# Altium footprint library 单平台共享多内核实验平台研制与应用.PcbLib: 46 footprints (part 1 of 3)
Each footprint in its own frame and in the unit in brackets; x right, y up, seen from the top. Pads: shape width x height; smd on the part's side, far side on the other; paste and mask are expansions set on the pad; w line width, h text height; cw(c..) or ccw(c..) is an arc to the next point about the centre after c.
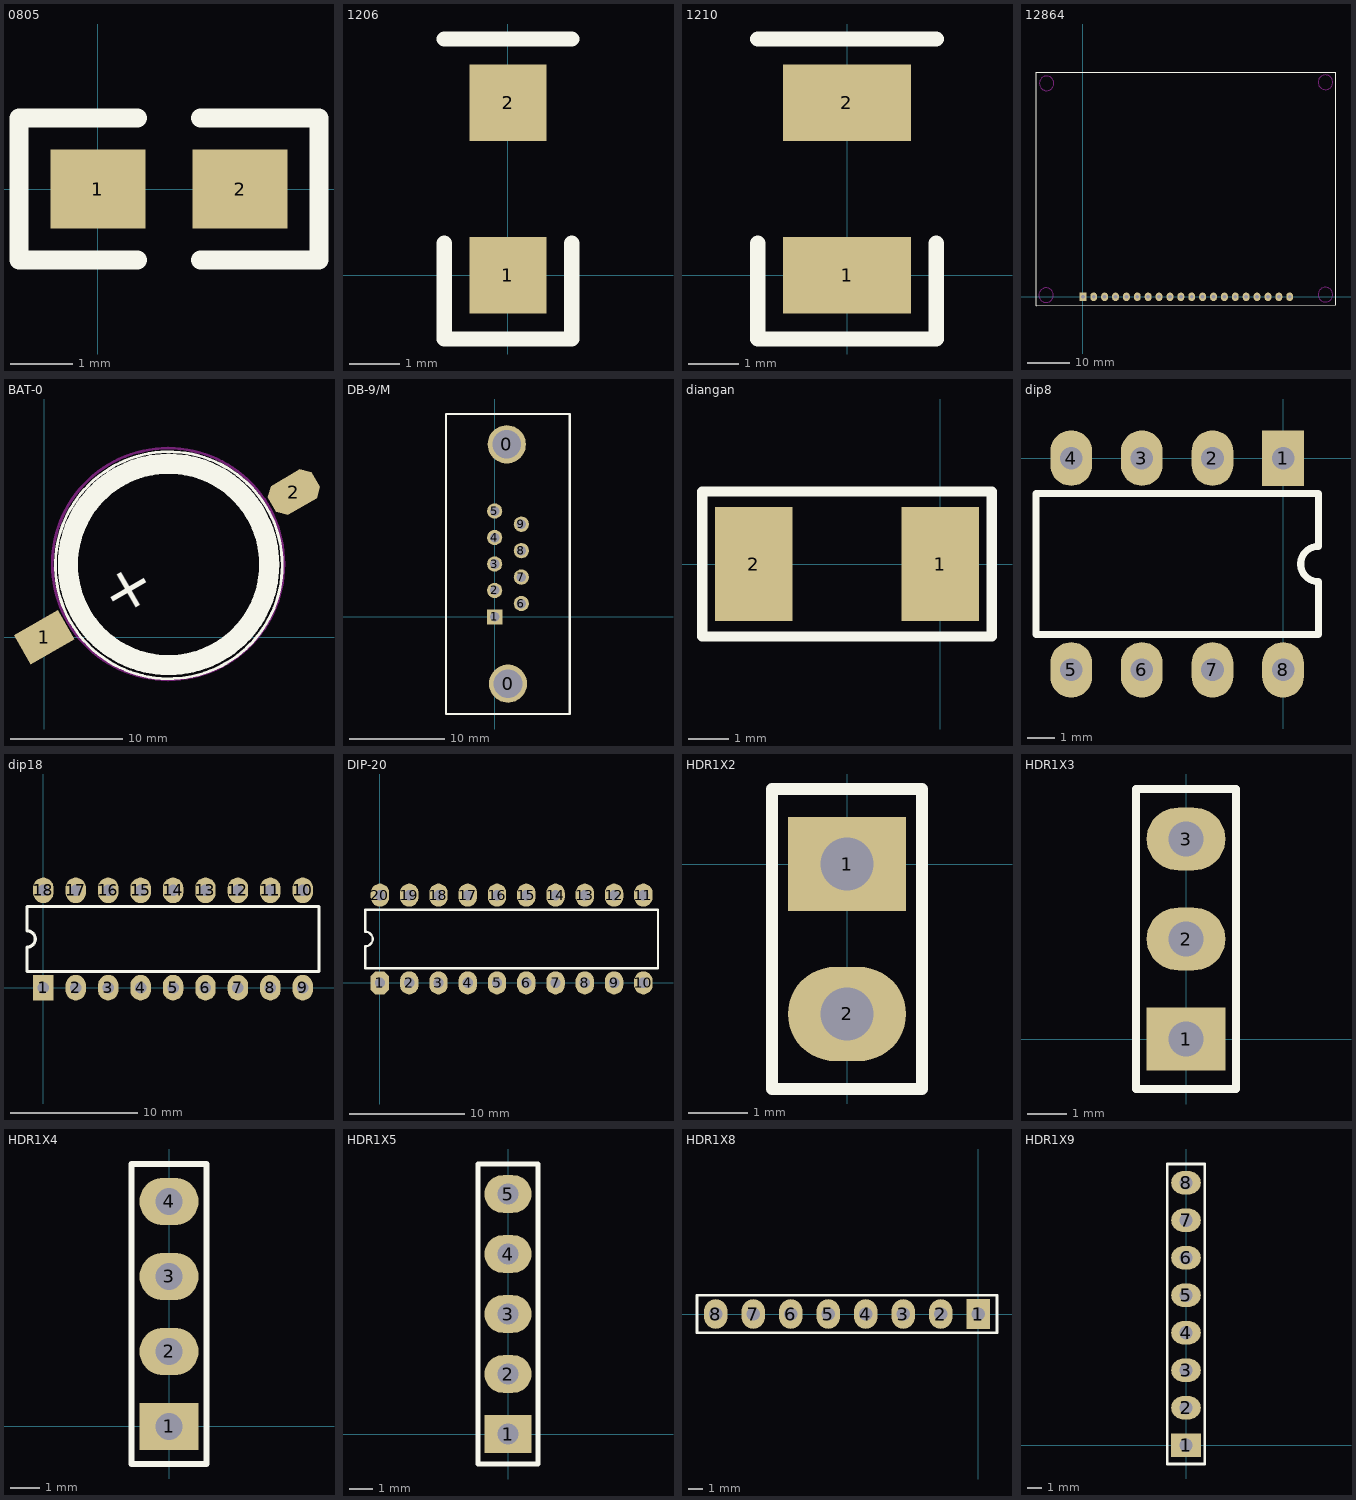
[diagram p0: the footprints below, top view; thin cyan lines are the x and y axes]

## 0805 [mil]
pads (2):
  rect 60x50 smd: 1(0,0) 2(90,0)
Top Overlay:
  lines w12: 25,-45 -50,-45 -50,45 25,45 ; 65,-45 140,-45 140,45 65,45

## 1206 [mil]
pads (2):
  rect 60x60 smd: 1(0,0) 2(0,135)
Top Overlay:
  lines w12: -50,25 -50,-50 50,-50 50,25 ; -50,185 50,185

## 1210 [mil]
pads (2):
  rect 100x60 smd: 1(0,0) 2(0,135)
Top Overlay:
  lines w12: -70,25 -70,-50 70,-50 70,25 ; -70,185 70,185

## 12864 [mm]
pads (20):
  rect 1.6x2 hole 0.9: 1(0,0)
  oval 1.6x2 hole 0.9: 2(2.54,0) 3(5.08,0) 4(7.62,0) 5(10.16,0) 6(12.7,0) 7(15.24,0) 8(17.78,0) 9(20.32,0) 10(22.86,0) 11(25.4,0) 12(27.94,0) 13(30.48,0) 14(33.02,0) 15(35.56,0) 16(38.1,0) 17(40.64,0) 18(43.18,0) 19(45.72,0) 20(48.26,0)
Top Overlay:
  lines w0.254: -10.922,-2.032 59.055,-1.905 59.055,-0.254 59.055,52.324 -0.762,52.324 -10.922,52.324 -10.922,47.244 -10.922,-2.032
Keep-Out Layer:
  circle w0.254: c56.589,50.038 r1.704
  circle w0.254: c56.589,0.508 r1.704
  circle w0.254: c-8.562,0.381 r1.704
  circle w0.254: c-8.435,49.784 r1.704

## BAT-0 [mm]
pads (2):
  rect 4.5x3 smd rot 30: 1(0,0)
  oct 4.5x3 smd rot 30: 2(22.245,12.931)
Top Overlay:
  circle w1.8: c11.083,6.487 r8.977
  circle w0.254: c11.109,6.413 r10.115
  text "+" at 6.357,1.588 h4
Keep-Out Layer:
  circle w0.254: c11.045,6.523 r10.328

## DB-9/M [mm]
pads (11):
  round 4 hole 3: 0(1.27,18.059) 0(1.397,-6.985)
  rect 1.6x1.6 hole 1: 1(0,0)
  round 1.6 hole 1: 2(0,2.769) 3(0,5.537) 4(0,8.306) 5(0,11.074) 6(2.794,1.397) 7(2.794,4.166) 8(2.794,6.934) 9(2.794,9.703)
Top Overlay:
  lines w0.203: -5.08,-10.16 -5.08,21.234 7.874,21.234
  lines w0.254: -5.08,-10.16 7.874,-10.16 7.874,21.234

## diangan [mil]
pads (2):
  rect 75x110 smd: 1(0,0) 2(-180,0)
Top Overlay:
  lines w9.84: -230,-70 -230,70 -180,70 -170,70 50,70 50,-40 50,-50 50,-70 -230,-70

## dip8 [mm]
pads (8):
  rect 1.5x2 hole 0.813: 1(0,0)
  oval 1.5x2 hole 0.813: 2(-2.54,0) 3(-5.08,0) 4(-7.62,0) 5(-7.62,-7.62) 6(-5.08,-7.62) 7(-2.54,-7.62) 8(0,-7.62)
Top Overlay:
  lines w0.254: -8.89,-6.35 -8.89,-1.27 1.27,-1.27 1.27,-3.175 ccw(c1.27,-3.81) 1.27,-4.445 1.27,-6.35 -8.89,-6.35

## dip18 [mm]
pads (18):
  rect 1.6x2 hole 0.9: 1(0,0)
  oval 1.6x2 hole 0.9: 2(2.54,0) 3(5.08,0) 4(7.62,0) 5(10.16,0) 6(12.7,0) 7(15.24,0) 8(17.78,0) 9(20.32,0) 10(20.32,7.62) 11(17.78,7.62) 12(15.24,7.62) 13(12.7,7.62) 14(10.16,7.62) 15(7.62,7.62) 16(5.08,7.62) 17(2.54,7.62) 18(0,7.62)
Top Overlay:
  lines w0.254: -1.27,1.27 21.59,1.27 21.59,6.35 -1.27,6.35 -1.27,4.445 cw(c-1.27,3.81) -1.27,3.175 -1.27,1.27

## DIP-20 [mm]
pads (20):
  oct 1.6x2 hole 0.9: 1(0,0)
  oval 1.6x2 hole 0.9: 2(2.54,0) 3(5.08,0) 4(7.62,0) 5(10.16,0) 6(12.7,0) 7(15.24,0) 8(17.78,0) 9(20.32,0) 10(22.86,0) 11(22.86,7.62) 12(20.32,7.62) 13(17.78,7.62) 14(15.24,7.62) 15(12.7,7.62) 16(10.16,7.62) 17(7.62,7.62) 18(5.08,7.62) 19(2.54,7.62) 20(0,7.62)
Top Overlay:
  lines w0.2: -1.27,1.27 24.13,1.27 24.13,6.35 -1.27,6.35 -1.27,4.445 cw(c-1.27,3.81) -1.27,3.175 -1.27,1.27

## HDR1X2 [mm]
pads (2):
  rect 2x1.6 hole 0.9: 1(0,0)
  oval 2x1.6 hole 0.9: 2(0,-2.54)
Top Overlay:
  lines w0.2: -1.27,-3.81 -1.27,1.27 1.27,1.27 1.27,-3.81 -1.27,-3.81

## HDR1X3 [mm]
pads (3):
  rect 2x1.6 hole 0.9: 1(0,0)
  oval 2x1.6 hole 0.9: 2(0,2.54) 3(0,5.08)
Top Overlay:
  lines w0.2: -1.27,-1.27 1.27,-1.27 1.27,6.35 -1.27,6.35 -1.27,-1.27

## HDR1X4 [mm]
pads (4):
  rect 2x1.6 hole 0.9: 1(0,0)
  oval 2x1.6 hole 0.9: 2(0,2.54) 3(0,5.08) 4(0,7.62)
Top Overlay:
  lines w0.2: -1.27,-1.27 -1.27,8.89 1.27,8.89 1.27,-1.27 -1.27,-1.27

## HDR1X5 [mm]
pads (5):
  rect 2x1.6 hole 0.9: 1(0,0)
  oval 2x1.6 hole 0.9: 2(0,2.54) 3(0,5.08) 4(0,7.62) 5(0,10.16)
Top Overlay:
  lines w0.2: -1.27,-1.27 1.27,-1.27 1.27,11.43 -1.27,11.43 -1.27,-1.27

## HDR1X8 [mm]
pads (8):
  rect 1.6x2 hole 0.9: 1(0,0)
  oval 1.6x2 hole 0.9: 2(-2.54,0) 3(-5.08,0) 4(-7.62,0) 5(-10.16,0) 6(-12.7,0) 7(-15.24,0) 8(-17.78,0)
Top Overlay:
  lines w0.2: -19.05,-1.27 1.27,-1.27 1.27,1.27 -19.05,1.27 -19.05,-1.27

## HDR1X9 [mm]
pads (8):
  rect 2x1.6 hole 0.9: 1(0,0)
  oval 2x1.6 hole 0.9: 2(0,2.54) 3(0,5.08) 4(0,7.62) 5(0,10.16) 6(0,12.7) 7(0,15.24) 8(0,17.78)
Top Overlay:
  lines w0.2: -1.27,-1.27 -1.27,19.05 1.27,19.05 1.27,-1.27 -1.27,-1.27